# Altium footprint library UWB_CAN_R2.PcbLib: 83 footprints (part 3 of 6)
Each footprint in its own frame and in the unit in brackets; x right, y up, seen from the top. Pads: shape width x height; smd on the part's side, far side on the other; paste and mask are expansions set on the pad; w line width, h text height; cw(c..) or ccw(c..) is an arc to the next point about the centre after c.
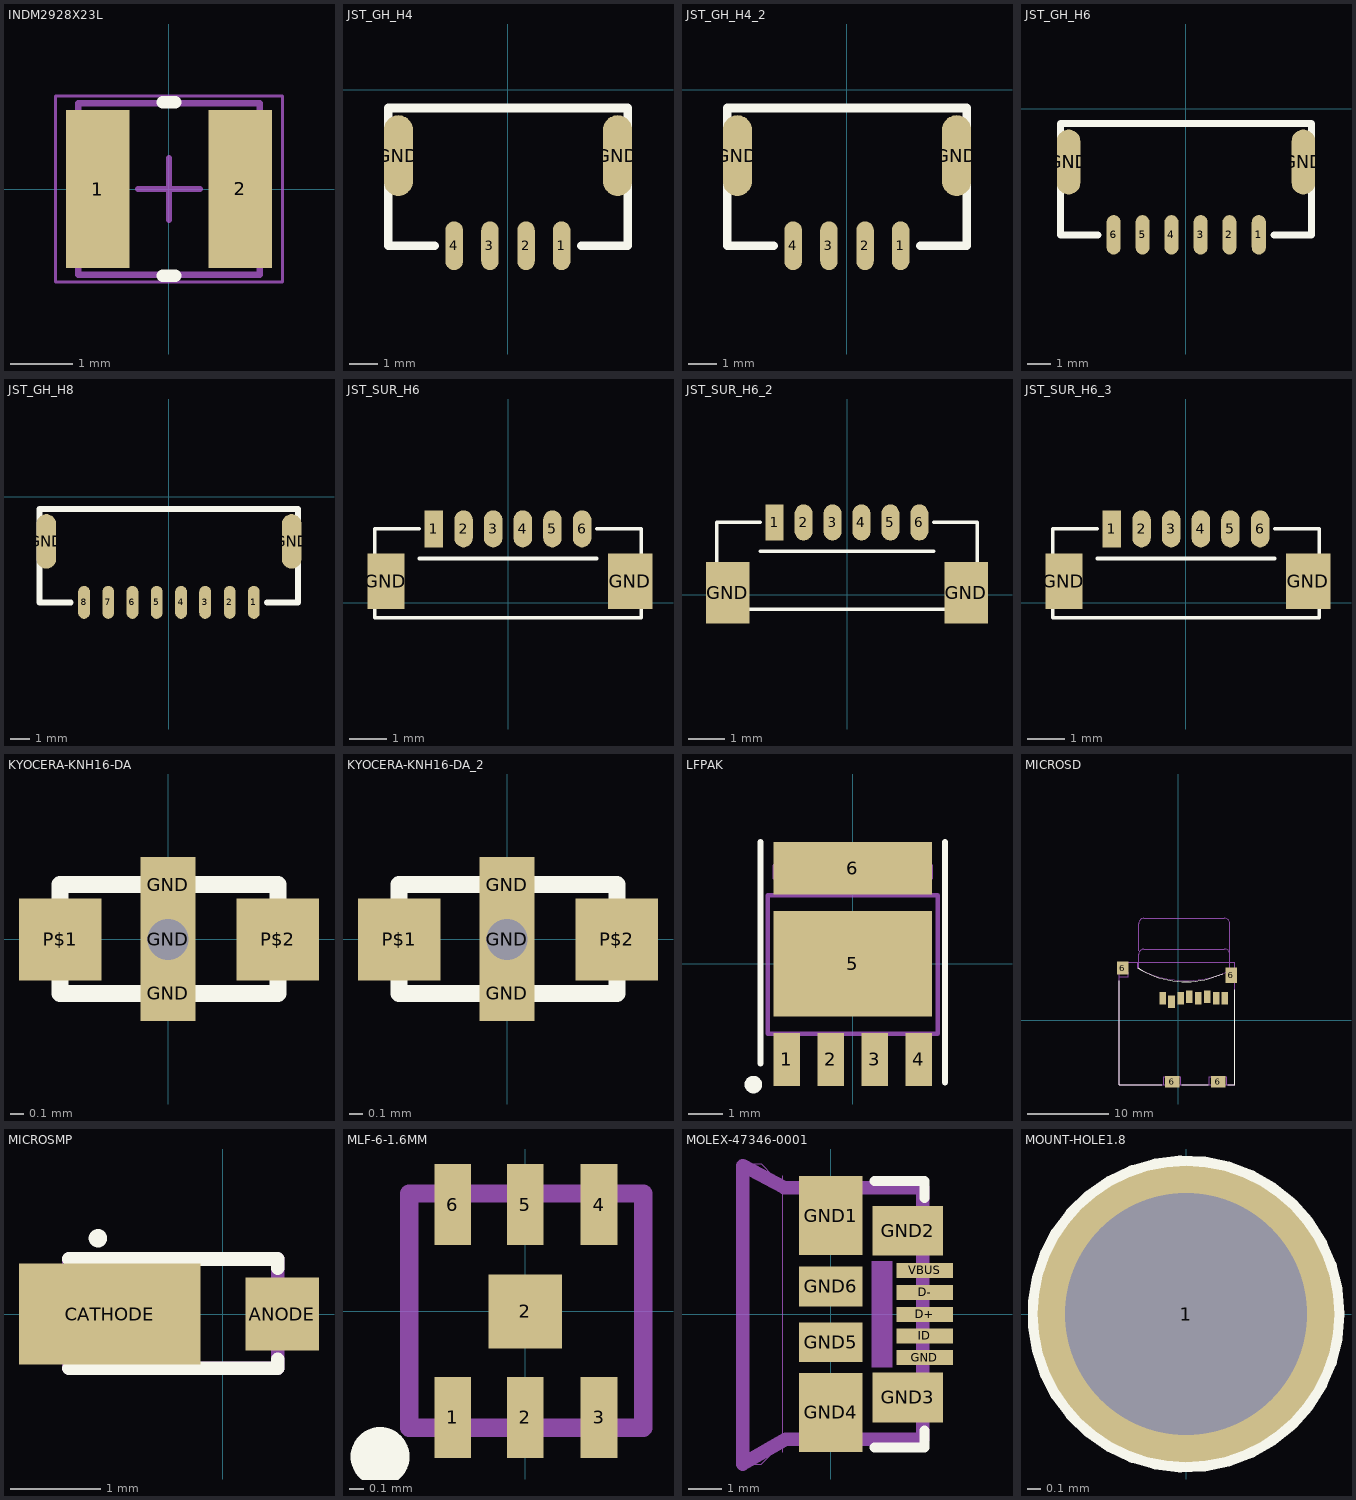
[diagram p2: the footprints below, top view; thin cyan lines are the x and y axes]

## INDM2928X23L [mm] "Molded Inductor, 2-Leads, Body 2.92x2.76mm, IPC High Density"
height 2.29
pads (2):
  rect 1.02x2.54 smd: 1(-1.145,0) 2(1.145,0)
Top Overlay:
  lines w0.2: -0.1,-1.4 0.1,-1.4 ; -0.1,1.4 0.1,1.4
Mechanical 13:
  lines w0.1: -1.46,-1.38 -1.46,1.38 1.46,1.38 1.46,-1.38 -1.46,-1.38
Mechanical 15:
  lines w0.05: -1.825,-1.5 -1.825,1.5 1.825,1.5 1.825,-1.5 -1.825,-1.5
  lines w0.1: -0.5,0 0.5,0 ; 0,-0.5 0,0.5
3D body "INDM2928X23L.step": height 2.29, standoff 0, extent -1.68,-1.38 1.68,1.38

## JST_GH_H4 [mil]
pads (6):
  rrect100% 24x67 smd: 1(74,-214.57) 2(25,-214.57) 3(-24.61,-214.57) 4(-73.82,-214.57)
  rrect100% 40x111 smd: GND(-150.59,-90.55) GND(151,-90.55)
Top Overlay:
  lines w12: -100.79,-214.57 -164.37,-214.57 -164.37,-25 165,-25 165,-214.57 101,-214.57
  text "." at 110,-225 h155
3D body "SM04B-GHS-TB.STEP": height 170.32, standoff -0.94, extent -161.63,-234.26 163.17,-43.31

## JST_GH_H4_2 [mil]
pads (6):
  rrect100% 24x67 smd: 1(74,-214.57) 2(25,-214.57) 3(-24.61,-214.57) 4(-73.82,-214.57)
  rrect100% 40x111 smd: GND(-150.59,-90.55) GND(151,-90.55)
Top Overlay:
  lines w12: -100.79,-214.57 -164.37,-214.57 -164.37,-25 165,-25 165,-214.57 101,-214.57
  text "." at 110,-225 h155
3D body "SM04B-GHS-TB.STEP": height 170.32, standoff -0.94, extent -161.63,-234.26 163.17,-43.32

## JST_GH_H6 [mil]
pads (8):
  rrect100% 24x67 smd: 1(124,-214.57) 2(74,-214.57) 3(25,-214.57) 4(-24.61,-214.57) 5(-73.82,-214.57) 6(-123.03,-214.57)
  rrect100% 40x111 smd: GND(-199.8,-90.55) GND(200,-90.55)
Top Overlay:
  lines w12: -150,-214.57 -213.58,-214.57 -213.58,-25 214,-25 214,-214.57 150,-214.57
  text "." at 160,-225 h155
3D body "SM06B-GHS-TB.STEP": height 170.32, standoff -0.94, extent -211.61,-234.95 211.61,-44

## JST_GH_H8 [mil]
pads (10):
  rrect100% 24x67 smd: 1(173,-214.57) 2(124,-214.57) 3(74,-214.57) 4(25,-214.57) 5(-24.61,-214.57) 6(-73.82,-214.57) 7(-123.03,-214.57) 8(-172.24,-214.57)
  rrect100% 40x111 smd: GND(-249.02,-90.55) GND(250,-90.55)
Top Overlay:
  lines w12: -199.21,-214.57 -262.8,-214.57 -262.8,-25 263,-25 263,-214.57 200,-214.57
  text "." at 210,-225 h155
3D body "SM08B-GHS-TB.STEP": height 170.32, standoff -2.91, extent -260.83,-232.95 260.82,-42

## JST_SUR_H6 [mm]
height 1.1
pads (8):
  rect 0.5x1 smd: 1(-2,2)
  rrect100% 0.5x1 smd: 2(-1.2,2) 3(-0.4,2) 4(0.4,2) 5(1.2,2) 6(2,2)
  rect 1x1.5 smd: GND(-3.3,0.585)
  rect 1.2x1.5 smd: GND(3.3,0.585)
Top Overlay:
  lines w0.1: -2.4,1.2 2.4,1.2 ; -2.4,2 -3.6,2 -3.6,-0.4 3.6,-0.4 3.6,2 2.4,2
  text "." at -2.4,2.8 h0.7
3D body "SM06B-SURS-TF.STEP": height 1.7, standoff -0.05, extent -3.5,-0.4 3.5,2.3

## JST_SUR_H6_2 [mm]
pads (8):
  rect 0.5x1 smd: 1(-2,2)
  rrect100% 0.5x1 smd: 2(-1.2,2) 3(-0.4,2) 4(0.4,2) 5(1.2,2) 6(2,2)
  rect 1.2x1.7 smd: GND(-3.3,0.05) GND(3.3,0.05)
Top Overlay:
  lines w0.1: -2.4,1.2 2.4,1.2 ; -2.4,2 -3.6,2 -3.6,-0.4 3.6,-0.4 3.6,2 2.4,2
  text "." at -2.4,2.8 h0.7
3D body "SM06B-SURS-TF.STEP": height 1.7, standoff -0.05, extent -3.5,-0.4 3.5,2.3

## JST_SUR_H6_3 [mm]
pads (8):
  rect 0.5x1 smd: 1(-2,2)
  rrect100% 0.5x1 smd: 2(-1.2,2) 3(-0.4,2) 4(0.4,2) 5(1.2,2) 6(2,2)
  rect 1x1.5 smd: GND(-3.3,0.585)
  rect 1.2x1.5 smd: GND(3.3,0.585)
Top Overlay:
  lines w0.1: -2.4,1.2 2.4,1.2 ; -2.4,2 -3.6,2 -3.6,-0.4 3.6,-0.4 3.6,2 2.4,2
  text "." at -2.4,2.8 h0.7
3D body "SM06B-SURS-TF.STEP": height 1.7, standoff -0.05, extent -3.5,-0.4 3.5,2.3

## KYOCERA-KNH16-DA [mil] "KYOCERA-KNH16-DA"
pads (5):
  rect 16x16 smd: GND(0,-15.75) GND(0,16)
  rect 16x16 hole 12: GND(0,0)
  rect 24x24 smd: P$1(-31.5,0) P$2(32,0)
Top Overlay:
  lines w5: -31.5,-15.75 32,-15.75 32,16 -31.5,16 -31.5,-15.75
3D body "KYOCERA-KNH16-DA.STEP": height 13.78, standoff 0, extent -19.68,-9.84 19.69,9.84

## KYOCERA-KNH16-DA_2 [mil]
pads (5):
  rect 16x16 smd: GND(0,-15.75) GND(0,16)
  rect 16x16 hole 12: GND(0,0)
  rect 24x24 smd: P$1(-31.5,0) P$2(32,0)
Top Overlay:
  lines w5: -31.5,-15.75 -31.5,16 32,16 32,-15.75 -31.5,-15.75
3D body "KYOCERA-KNH16-DA.STEP": height 13.78, standoff 0, extent -19.69,-9.84 19.69,9.84

## LFPAK [mm] "Renesas LFPAK recommended land pattern  2008-05-26, page 17 of REJ11K0001_surface.pdf"
height 1.1
pads (6):
  rect 0.76x1.52 smd: 1(-1.905,-2.76) 2(-0.635,-2.76) 3(0.635,-2.76) 4(1.905,-2.76)
  rect 4.57x3.04 smd paste-1.52: 5(0,0)
  rect 4.57x1.52 smd paste-0.76: 6(0,2.76)
Top Overlay:
  circle w0.254: c-2.865,-3.485 r0.127
  lines w0.178: -2.66,-2.868 -2.66,3.52 ; 2.66,3.52 2.66,-3.421
Top Paste:
  rectangle: 0.135,2.1 2.17,3.42
  rectangle: -2.2,2.1 -0.165,3.42
  rectangle: -2.2,0.145 -0.165,1.415
  rectangle: 0.135,0.145 2.17,1.415
  rectangle: 0.135,-1.425 2.17,-0.155
  rectangle: -2.2,-1.425 -0.165,-0.155
Mechanical 5:
  lines w0.127: -2.43,-2.007 -2.445,-2.022 ; -2.43,1.963 -2.445,1.978 ; -2.15,-2.022 -2.15,-2.072 -2.15,-2.455 -2.15,-2.537 -2.15,-2.7 -2.15,-3.25 -1.65,-3.25 -1.65,-2.7 -1.65,-2.537 -1.65,-2.455 -1.65,-2.072 -1.65,-2.022 ; -2.145,1.978 -2.145,2.478 -2.245,2.478 -2.245,2.828 -2.145,2.828 -2.145,3.078 ; -2.145,3.078 cw(c-2.045,3.078) -2.045,3.178 2.055,3.178 cw(c2.055,3.078) 2.155,3.078 2.155,2.828 2.255,2.828 2.255,2.478 2.155,2.478 2.155,1.978 ; -1.045,1.978 -1.045,2.035 cw(c-0.945,2.035) -0.945,2.135 0.955,2.135 cw(c0.955,2.035) 1.055,2.035 1.055,1.978 ; -0.88,-2.022 -0.88,-2.072 -0.88,-2.455 -0.88,-2.537 -0.88,-2.7 -0.88,-3.25 -0.38,-3.25 -0.38,-2.7 -0.38,-2.537 -0.38,-2.455 -0.38,-2.072 -0.38,-2.022 ; 0.39,-2.022 0.39,-2.072 0.39,-2.455 0.39,-2.537 0.39,-2.7 0.39,-3.25 0.89,-3.25 0.89,-2.7 0.89,-2.537 0.89,-2.455 0.89,-2.072 0.89,-2.022 ; 1.66,-2.022 1.66,-2.072 1.66,-2.455 1.66,-2.537 1.66,-2.7 1.66,-3.25 2.16,-3.25 2.16,-2.7 2.16,-2.537 2.16,-2.455 2.16,-2.072 2.16,-2.022 ; 2.44,-2.007 2.455,-2.022 ; 2.44,1.963 2.455,1.978 ; -2.445,-2.022 2.455,-2.022 ; -2.445,-2.022 -2.445,1.978 ; -2.445,1.978 2.455,1.978 ; 2.455,-2.022 2.455,1.978
3D body "LFPAK.stp": height 1.18, standoff -0.02, extent -2.45,-3.228 2.45,3.2

## MICROSD [mil] "MICROSD"
height 43.31
pads (12):
  rect 32x60 smd: 1(-76.38,107) 2(-33.07,91) 3(11,107) 4(54,115) 5(97,107) 6(141,115) 7(184,107) 8(227,107)
  rect 56x63.19 smd: 6(-269.69,254.05)
  rect 71x56 smd: 6(-29.53,-299.21) 6(195,-299.21)
  rect 56x75 smd: 6(258,219)
Top Overlay:
  lines w5: -287.4,193 -287.4,-314.96 -80.71,-314.96 ; -196.85,256 ccw(c35.12,618.63) 216,228 ; 17,-314.96 145,-314.96 ; 242,-314.96 276,-314.96 276,150
Mechanical 16:
  lines w0: -192.91,252 -192.91,322 cw(c-167.81,321.9) -167.7,347 225,347 cw(c224.5,319.5) 252,319 252,249 ; -192.91,339 -192.91,471 cw(c-167.31,471.4) -167.7,497 225,497 cw(c224.5,469.5) 252,469 252,331
  lines w4: -287.4,-314.96 276,-314.96 276,284 -287.4,284 -287.4,-314.96
  lines w5: -287.4,-314.96 -287.4,213 -244.09,213 -244.09,233 -287.4,233 -287.4,284 -196.85,284 -196.85,256 ccw(c37.61,660) 252,245 256,249 276,249 276,-314.96 237,-314.96 237,-275.59 221,-275.59 221,-314.96 162,-314.96 162,-275.59 150,-275.59 150,-314.96 12,-314.96 12,-275.59 -3.94,-275.59 -3.94,-314.96 -59.06,-314.96 -59.06,-275.59 -70.87,-275.59 -70.87,-314.96 -287.4,-314.96
Mechanical 30:
  text "card IN" at -27.56,308 h49.6
  text "card OUT" at -51.18,457 h49.6
3D body "2908-05xx-xx-02.STEP": height 72.83, standoff -1.97, extent -275.59,-315.2 275.59,285.2

## MICROSMP [mil]
pads (2):
  rect 32x32 smd: ANODE(26,0)
  rect 79x44 smd: CATHODE(-49.21,0)
Top Overlay:
  circle w4: c-54.33,33 r2
  lines w6: -66.93,-23.62 24,-23.62 24,-19.68 ; -66.93,24 24,24 24,20
Mechanical 16:
  rectangle: -74.8,-17.72 -68.9,18
  rectangle: 26.01,-11.81 30.01,12
  rectangle: -59.05,-21.65 -49.21,22
  lines w1: -66.93,-23.62 24,-23.62 24,24 -66.93,24 -66.93,-23.62
  lines w6: -66.93,-23.62 24,-23.62 24,24 -66.93,24 -66.93,-23.62

## MLF-6-1.6MM [mil] "MLF-6-1.6MM"
pads (7):
  rect 10x22 smd: 1(-19.68,-28.74) 2(0,-28.74) 3(20,-28.74) 4(20,29) 5(0,29) 6(-19.68,29)
  rect 20x20 smd: 2(0,0)
Top Overlay:
  circle w12: c-39.37,-39.37 r2
Mechanical 16:
  lines w5: -31.5,-31.5 32,-31.5 32,32 -31.5,32 -31.5,-31.5

## MOLEX-47346-0001 [mil]
height 43.31
pads (11):
  rect 67x18 smd: D+(111,0) D-(111,26) GND(111,-51.18) ID(111,-25.59) VBUS(111,52)
  rect 75x94 smd: GND1(0,117) GND4(0,-116.14)
  rect 83x59 smd: GND2(91,99) GND3(91,-98.43)
  rect 75x47 smd: GND5(0,-32.97) GND6(0,33)
Top Overlay:
  lines w12: 52,-157.48 111,-157.48 111,-137.8 ; 52,158 111,158 111,138
Mechanical 8:
  rectangle: 48,-62.99 73,63
Mechanical 16:
  lines w0: -57.09,-163.39 -57.09,164
  lines w1: -106.3,-177.17 -106.3,178 -82.68,178 -55.12,150 107,150 111,146 111,-145.67 107,-149.61 -55.12,-149.61 -82.68,-177.17 -106.3,-177.17
  lines w16: -104.33,-177.17 -104.33,176 -55.12,150 109,150 109,-147.64 -53.15,-147.64 -104.33,-177.17
3D body "473460001.stp": height 107.09, standoff -8.66, extent -93.7,-157.08 120.08,157.09

## MOUNT-HOLE1.8 [mil]
pads (1):
  round 87 hole 71: 1(0,0)
Top Overlay:
  circle w5: c0,0 r44
Bottom Overlay:
  circle w5: c0,0 r44
  circle w5: c0,0 r44